# Altium schematic symbol library FPGA_Xilinx_Virtex5.SchLib: 41 symbols (part 27 of 27)
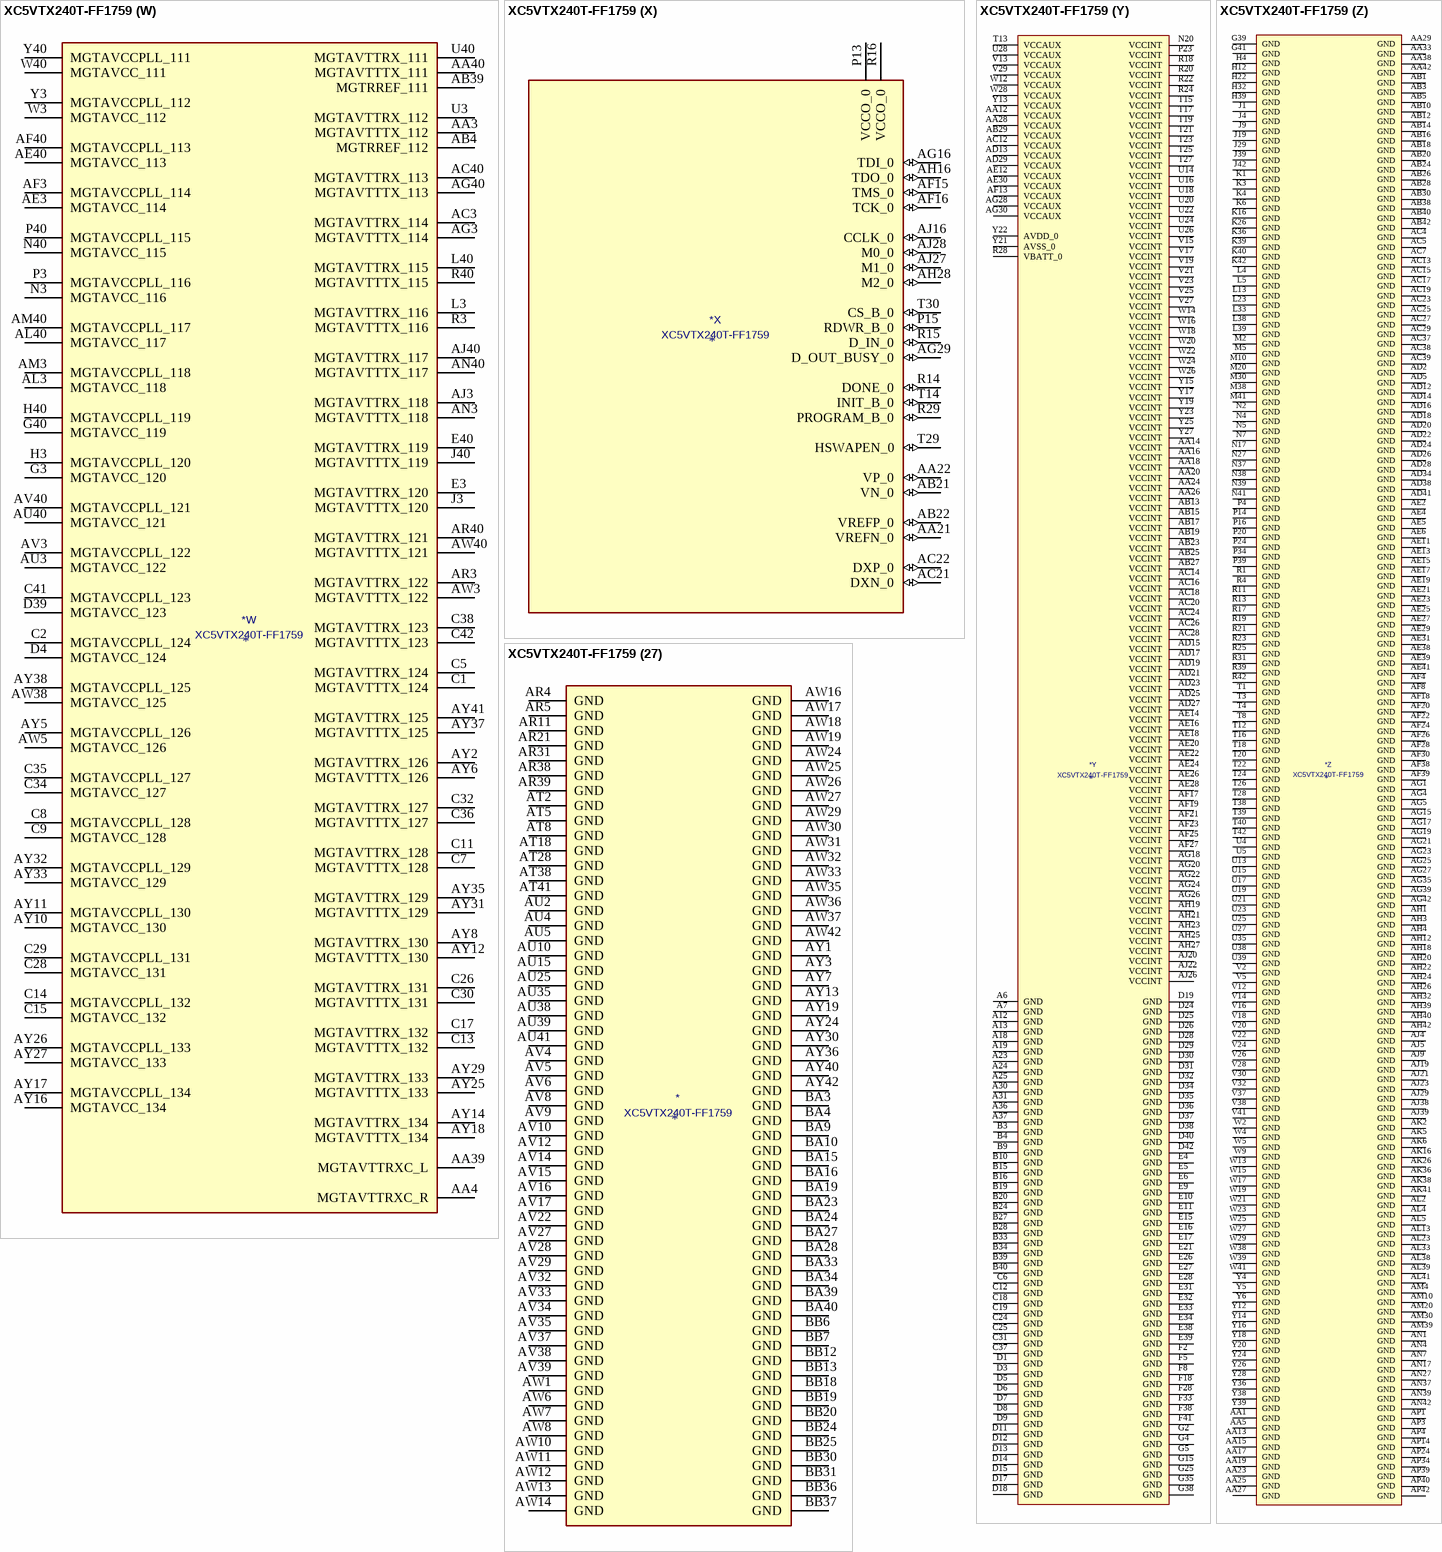
[diagram p163: symbol XC5VTX240T-FF1759]

## XC5VTX240T-FF1759
designator *  value XC5VTX240T-FF1759
ki_keywords: FPGA; ki_description: Virtex 5 TXT 240 XC5VTX240T-FF1759
part A pins: AA30 IO_L11P_CC_SM14P_11 (io), AA31 IO_L11N_CC_SM14N_11 (io), AA32 IO_L6N_11 (io), AA34 IO_L17N_SM11N_11 (io), AA35 IO_L13P_11 (io), AA36 IO_L4P_11 (io), AA37 IO_L2P_11 (io), AB31 IO_L19N_SM9N_11 (io), AB32 IO_L19P_SM9P_11 (io), AB34 IO_L17P_SM11P_11 (io), AB35 VCCO_11 (power), AB36 IO_L15N_SM13N_11 (io), AB37 IO_L4N_VREF_11 (io), AC36 IO_L15P_SM13P_11 (io), L14 IO_L5P_A9_D25_1 (io), M14 IO_L5N_A8_D24_1 (io), M15 VCCO_1 (power), M16 IO_L7P_A5_D21_1 (io), M29 IO_L6P_A7_D23_1 (io), N14 IO_L9N_CC_A0_D16_1 (io), N15 IO_L9P_CC_A1_D17_1 (io), N16 IO_L7N_A4_D20_1 (io), N18 IO_L3P_A13_D29_1 (io), N19 IO_L1P_A17_1 (io), N25 IO_L2N_A14_D30_1 (io), N26 IO_L2P_A15_D31_1 (io), N28 IO_L4P_A11_D27_1 (io), N29 IO_L6N_A6_D22_1 (io), P17 IO_L3N_A12_D28_1 (io), P18 IO_L1N_A16_1 (io), P19 VCCO_1 (power), P25 IO_L0N_A18_1 (io), P26 IO_L0P_A19_1 (io), P27 IO_L4N_VREF_A10_D26_1 (io), P28 IO_L8P_CC_A3_D19_1 (io), P29 VCCO_1 (power), R26 VCCO_1 (power), R27 IO_L8N_CC_A2_D18_1 (io), T35 IO_L12P_VRN_11 (io), T36 IO_L12N_VRP_11 (io), T37 IO_L9N_CC_11 (io), U30 VCCO_11 (power), U31 IO_L18P_SM10P_11 (io), U32 IO_L16P_SM12P_11 (io), U33 IO_L14P_11 (io), U34 IO_L14N_VREF_11 (io), U36 VCCO_11 (power), U37 IO_L9P_CC_11 (io), V31 IO_L18N_SM10N_11 (io), V33 IO_L16N_SM12N_11 (io), V34 IO_L7N_11 (io), V35 IO_L7P_11 (io), V36 IO_L3N_11 (io), W30 IO_L10P_CC_SM15P_11 (io), W31 IO_L10N_CC_SM15N_11 (io), W32 IO_L5N_11 (io), W33 IO_L5P_11 (io), W34 VCCO_11 (power), W35 IO_L1P_11 (io), W36 IO_L1N_11 (io), W37 IO_L3P_11 (io), Y29 IO_L0N_11 (io), Y30 IO_L0P_11 (io), Y31 VCCO_11 (power), Y32 IO_L6P_11 (io), Y33 IO_L8P_CC_11 (io), Y34 IO_L8N_CC_11 (io), Y35 IO_L13N_11 (io), Y37 IO_L2N_11 (io)
part B pins: AA6 IO_L5N_12 (io), AA7 IO_L5P_12 (io), AA8 VCCO_12 (power), AA9 IO_L3P_12 (io), AA10 IO_L10N_CC_12 (io), AA11 IO_L10P_CC_12 (io), AB6 IO_L7P_12 (io), AB7 IO_L9N_CC_12 (io), AB8 IO_L9P_CC_12 (io), AB9 IO_L12N_VRP_12 (io), AB11 IO_L18N_12 (io), AB33 IO_L2P_SM6P_13 (io), AC6 IO_L7N_12 (io), AC8 IO_L12P_VRN_12 (io), AC9 IO_L14P_12 (io), AC10 IO_L16N_12 (io), AC11 IO_L18P_12 (io), AC30 IO_L8N_CC_SM1N_13 (io), AC31 IO_L8P_CC_SM1P_13 (io), AC32 VCCO_13 (power), AC33 IO_L2N_SM6N_13 (io), AC34 IO_L0N_SM8N_13 (io), AC35 IO_L0P_SM8P_13 (io), AD8 IO_L14N_VREF_12 (io), AD9 VCCO_12 (power), AD11 IO_L16P_12 (io), AD30 IO_L16N_13 (io), AD31 IO_L16P_13 (io), AD32 IO_L15P_13 (io), AD33 IO_L15N_13 (io), AD35 IO_L6P_SM3P_13 (io), AD36 IO_L4N_VREF_13 (io), AD37 IO_L4P_13 (io), AE32 IO_L12N_VRP_13 (io), AE33 IO_L12P_VRN_13 (io), AE34 IO_L10N_CC_13 (io), AE35 IO_L6N_SM3N_13 (io), AE36 VCCO_13 (power), AE37 IO_L11N_CC_13 (io), AF31 IO_L5N_SM4N_13 (io), AF32 IO_L5P_SM4P_13 (io), AF33 VCCO_13 (power), AF34 IO_L10P_CC_13 (io), AF35 IO_L17N_13 (io), AF36 IO_L17P_13 (io), AF37 IO_L11P_CC_13 (io), AG31 IO_L1N_SM7N_13 (io), AG32 IO_L1P_SM7P_13 (io), AG33 IO_L3N_SM5N_13 (io), AG34 IO_L3P_SM5P_13 (io), AG36 IO_L19P_13 (io), AG37 IO_L19N_13 (io), AG38 IO_L13N_13 (io), AH36 IO_L18N_13 (io), AH37 VCCO_13 (power), AH38 IO_L13P_13 (io), AJ36 IO_L18P_13 (io), AJ37 IO_L14N_VREF_13 (io), AK37 IO_L14P_13 (io), AL36 IO_L7N_SM2N_13 (io), AL37 IO_L7P_SM2P_13 (io), AM37 VCCO_13 (power), AM38 IO_L9P_CC_SM0P_13 (io), AN38 IO_L9N_CC_SM0N_13 (io), N6 IO_L19N_12 (io), P5 IO_L0N_12 (io), P6 IO_L19P_12 (io), P7 IO_L17N_12 (io), R5 IO_L0P_12 (io), R6 VCCO_12 (power), R7 IO_L17P_12 (io), T5 IO_L2N_12 (io), T6 IO_L2P_12 (io), T7 IO_L11N_CC_12 (io), U6 IO_L4N_VREF_12 (io), U7 IO_L11P_CC_12 (io), V6 IO_L4P_12 (io), V7 VCCO_12 (power), V8 IO_L15P_12 (io), V9 IO_L15N_12 (io), W6 IO_L8N_CC_12 (io), W7 IO_L8P_CC_12 (io), W8 IO_L6P_12 (io), W10 IO_L13N_12 (io), W11 IO_L13P_12 (io), Y7 IO_L1P_12 (io), Y8 IO_L1N_12 (io), Y9 IO_L6N_12 (io), Y10 IO_L3N_12 (io), Y11 VCCO_12 (power)
part C pins: AD6 IO_L1N_14 (io), AD7 IO_L1P_14 (io), AD10 IO_L17P_14 (io), AE7 VCCO_14 (power), AE8 IO_L3P_14 (io), AE9 IO_L16N_14 (io), AE10 IO_L17N_14 (io), AF5 IO_L5P_14 (io), AF6 IO_L5N_14 (io), AF7 IO_L3N_14 (io), AF9 IO_L16P_14 (io), AF10 IO_L8P_CC_14 (io), AF11 IO_L2P_14 (io), AF12 IO_L0N_14 (io), AG6 IO_L7P_14 (io), AG7 IO_L9P_CC_14 (io), AG8 IO_L10P_CC_14 (io), AG9 IO_L8N_CC_14 (io), AG10 VCCO_14 (power), AG11 IO_L2N_14 (io), AG12 IO_L0P_14 (io), AH5 IO_L7N_14 (io), AH6 IO_L9N_CC_14 (io), AH7 VCCO_14 (power), AH8 IO_L10N_CC_14 (io), AH9 IO_L13P_14 (io), AH10 IO_L4N_VREF_14 (io), AH11 IO_L4P_14 (io), AH17 VCCO_2 (power), AJ6 IO_L12P_VRN_14 (io), AJ7 IO_L12N_VRP_14 (io), AJ8 IO_L13N_14 (io), AJ17 IO_L0P_CC_RS1_2 (io), AJ18 IO_L2N_A22_2 (io), AK7 IO_L14P_14 (io), AK8 IO_L11P_CC_14 (io), AK9 IO_L6P_14 (io), AK17 IO_L0N_CC_RS0_2 (io), AK18 IO_L2P_A23_2 (io), AK19 IO_L8N_D2_FS2_2 (io), AK27 IO_L1N_CC_A24_2 (io), AK28 IO_L1P_CC_A25_2 (io), AL6 IO_L14N_VREF_14 (io), AL7 IO_L11N_CC_14 (io), AL8 VCCO_14 (power), AL9 IO_L6N_14 (io), AL17 IO_L4P_FCS_B_2 (io), AL18 VCCO_2 (power), AL19 IO_L8P_D3_2 (io), AL27 IO_L3P_A21_2 (io), AL28 VCCO_2 (power), AM5 IO_L18P_14 (io), AM6 IO_L19P_14 (io), AM7 IO_L19N_14 (io), AM17 IO_L4N_VREF_FOE_B_MOSI_2 (io), AM18 IO_L6P_D7_2 (io), AM19 IO_L6N_D6_2 (io), AM27 IO_L3N_A20_2 (io), AN5 IO_L18N_14 (io), AN6 VCCO_14 (power), AN26 IO_L7N_D4_2 (io), AP5 IO_L15P_14 (io), AP6 IO_L15N_14 (io), AP25 IO_L9P_D1_FS1_2 (io), AP26 IO_L7P_D5_2 (io), AP27 IO_L5N_CSO_B_2 (io), AR25 IO_L9N_D0_FS0_2 (io), AR26 VCCO_2 (power), AR27 IO_L5P_FWE_B_2 (io)
part D pins: E7 IO_L3P_24 (io), E8 IO_L3N_24 (io), F6 IO_L5N_24 (io), F7 VCCO_24 (power), G6 IO_L5P_24 (io), G7 IO_L1P_24 (io), G8 IO_L1N_24 (io), G37 IO_L4P_23 (io), H5 IO_L7N_24 (io), H6 IO_L7P_24 (io), H7 VCCO_24 (power), H8 IO_L9N_CC_24 (io), H34 IO_L0N_23 (io), H35 IO_L2P_23 (io), H36 IO_L2N_23 (io), H37 VCCO_23 (power), H38 IO_L4N_VREF_23 (io), J5 IO_L14N_VREF_24 (io), J6 IO_L14P_24 (io), J7 IO_L18P_24 (io), J8 IO_L9P_CC_24 (io), J33 IO_L0P_23 (io), J34 VCCO_23 (power), J35 IO_L15N_23 (io), J36 IO_L15P_23 (io), J37 IO_L8P_CC_23 (io), J38 IO_L8N_CC_23 (io), K5 IO_L4N_VREF_24 (io), K7 IO_L19P_24 (io), K8 IO_L18N_24 (io), K9 IO_L12P_VRN_24 (io), K33 IO_L6N_23 (io), K34 IO_L6P_23 (io), K35 IO_L19N_23 (io), K37 IO_L17P_23 (io), K38 IO_L17N_23 (io), L6 IO_L4P_24 (io), L7 IO_L19N_24 (io), L8 VCCO_24 (power), L9 IO_L12N_VRP_24 (io), L34 IO_L19P_23 (io), L35 IO_L12P_VRN_23 (io), L36 IO_L12N_VRP_23 (io), L37 IO_L16N_23 (io), M6 IO_L17N_24 (io), M7 IO_L17P_24 (io), M8 IO_L15P_24 (io), M9 IO_L16N_24 (io), M34 IO_L14N_VREF_23 (io), M35 VCCO_23 (power), M36 IO_L10N_CC_23 (io), M37 IO_L16P_23 (io), N8 IO_L15N_24 (io), N9 IO_L16P_24 (io), N33 IO_L11N_CC_23 (io), N34 IO_L14P_23 (io), N35 IO_L7N_23 (io), N36 IO_L10P_CC_23 (io), P8 IO_L11N_CC_24 (io), P9 VCCO_24 (power), P10 IO_L10P_CC_24 (io), P33 IO_L11P_CC_23 (io), P35 IO_L7P_23 (io), P36 IO_L5N_23 (io), P37 IO_L1N_23 (io), P38 IO_L3N_23 (io), R8 IO_L8P_CC_24 (io), R9 IO_L11P_CC_24 (io), R10 IO_L10N_CC_24 (io), R32 IO_L13N_23 (io), R33 IO_L13P_23 (io), R34 IO_L9P_CC_23 (io), R35 IO_L5P_23 (io), R36 VCCO_23 (power), R37 IO_L1P_23 (io), R38 IO_L3P_23 (io), T9 IO_L8N_CC_24 (io), T10 IO_L13N_24 (io), T11 IO_L13P_24 (io), T31 IO_L18P_23 (io), T32 IO_L18N_23 (io), T33 VCCO_23 (power), T34 IO_L9N_CC_23 (io), U8 IO_L6N_24 (io), U9 IO_L6P_24 (io), U10 VCCO_24 (power), U11 IO_L2N_24 (io), U12 IO_L0N_24 (io), V10 IO_L2P_24 (io), V11 IO_L0P_24 (io)
part E pins: AH33 IO_L10N_CC_25 (io), AH34 IO_L10P_CC_25 (io), AH35 IO_L12P_VRN_25 (io), AJ10 IO_L4P_26 (io), AJ11 IO_L4N_VREF_26 (io), AJ12 IO_L9P_CC_26 (io), AJ31 IO_L3P_25 (io), AJ32 IO_L3N_25 (io), AJ33 IO_L0P_25 (io), AJ34 VCCO_25 (power), AJ35 IO_L12N_VRP_25 (io), AK10 IO_L2N_26 (io), AK11 VCCO_26 (power), AK12 IO_L9N_CC_26 (io), AK32 IO_L13P_25 (io), AK33 IO_L13N_25 (io), AK34 IO_L0N_25 (io), AK35 IO_L9N_CC_25 (io), AL10 IO_L2P_26 (io), AL11 IO_L7N_26 (io), AL12 IO_L10N_CC_26 (io), AL31 IO_L19P_25 (io), AL32 IO_L19N_25 (io), AL34 IO_L9P_CC_25 (io), AL35 IO_L18P_25 (io), AM8 IO_L17N_26 (io), AM9 IO_L17P_26 (io), AM11 IO_L7P_26 (io), AM12 IO_L10P_CC_26 (io), AM13 IO_L18P_26 (io), AM31 IO_L17P_25 (io), AM32 IO_L17N_25 (io), AM33 IO_L8N_CC_25 (io), AM34 IO_L6P_25 (io), AM35 VCCO_25 (power), AM36 IO_L18N_25 (io), AN8 IO_L15N_26 (io), AN9 IO_L6P_26 (io), AN10 IO_L6N_26 (io), AN11 IO_L3N_26 (io), AN12 VCCO_26 (power), AN13 IO_L18N_26 (io), AN31 IO_L15P_25 (io), AN32 VCCO_25 (power), AN33 IO_L8P_CC_25 (io), AN34 IO_L6N_25 (io), AN35 IO_L16N_25 (io), AN36 IO_L16P_25 (io), AP7 IO_L19N_26 (io), AP8 IO_L15P_26 (io), AP9 VCCO_26 (power), AP10 IO_L3P_26 (io), AP11 IO_L5P_26 (io), AP12 IO_L5N_26 (io), AP13 IO_L16P_26 (io), AP31 IO_L15N_25 (io), AP32 IO_L11P_CC_25 (io), AP33 IO_L11N_CC_25 (io), AP35 IO_L7N_25 (io), AP36 IO_L7P_25 (io), AP37 IO_L14P_25 (io), AP38 IO_L14N_VREF_25 (io), AR6 IO_L19P_26 (io), AR7 IO_L8P_CC_26 (io), AR8 IO_L0P_26 (io), AR9 IO_L0N_26 (io), AR10 IO_L1P_26 (io), AR12 IO_L16N_26 (io), AR35 IO_L4P_25 (io), AR36 VCCO_25 (power), AR37 IO_L5N_25 (io), AT6 IO_L13N_26 (io), AT7 IO_L8N_CC_26 (io), AT9 IO_L1N_26 (io), AT10 IO_L12N_VRP_26 (io), AT11 VCCO_26 (power), AT35 IO_L4N_VREF_25 (io), AT36 IO_L1P_25 (io), AT37 IO_L5P_25 (io), AU6 IO_L13P_26 (io), AU7 VCCO_26 (power), AU8 IO_L11P_CC_26 (io), AU9 IO_L12P_VRN_26 (io), AU11 IO_L14P_26 (io), AU36 IO_L2N_25 (io), AU37 IO_L1N_25 (io), AV7 IO_L11N_CC_26 (io), AV11 IO_L14N_VREF_26 (io), AV36 IO_L2P_25 (io)
part F pins: E12 IO_L4P_28 (io), E13 IO_L4N_VREF_28 (io), E14 IO_L15P_28 (io), E29 IO_L16P_27 (io), E30 IO_L14N_VREF_27 (io), E35 IO_L4N_VREF_27 (io), E36 IO_L4P_27 (io), E37 IO_L6P_27 (io), F9 IO_L0N_28 (io), F10 IO_L0P_28 (io), F11 IO_L2N_28 (io), F12 IO_L11N_CC_28 (io), F13 VCCO_28 (power), F14 IO_L15N_28 (io), F15 IO_L17P_28 (io), F29 IO_L16N_27 (io), F30 IO_L14P_27 (io), F31 IO_L12N_VRP_27 (io), F32 IO_L5N_27 (io), F34 IO_L3P_27 (io), F35 IO_L2P_27 (io), F36 VCCO_27 (power), F37 IO_L6N_27 (io), G9 IO_L3P_28 (io), G10 VCCO_28 (power), G11 IO_L2P_28 (io), G12 IO_L11P_CC_28 (io), G13 IO_L13N_28 (io), G14 IO_L17N_28 (io), G29 IO_L18P_27 (io), G30 VCCO_27 (power), G31 IO_L12P_VRN_27 (io), G32 IO_L5P_27 (io), G33 VCCO_27 (power), G34 IO_L3N_27 (io), G36 IO_L2N_27 (io), H9 IO_L3N_28 (io), H10 IO_L1N_28 (io), H11 IO_L8P_CC_28 (io), H13 IO_L13P_28 (io), H14 IO_L19P_28 (io), H15 IO_L19N_28 (io), H29 IO_L18N_27 (io), H30 IO_L10N_CC_27 (io), H31 IO_L7P_27 (io), H33 IO_L1N_27 (io), J10 IO_L5P_28 (io), J11 IO_L1P_28 (io), J12 IO_L8N_CC_28 (io), J13 IO_L6N_28 (io), J30 IO_L10P_CC_27 (io), J31 IO_L7N_27 (io), J32 IO_L1P_27 (io), K10 IO_L5N_28 (io), K11 VCCO_28 (power), K12 IO_L7N_28 (io), K13 IO_L7P_28 (io), K14 IO_L6P_28 (io), K29 IO_L9P_CC_27 (io), K30 IO_L0N_27 (io), K31 VCCO_27 (power), K32 IO_L8N_CC_27 (io), L10 IO_L10P_CC_28 (io), L11 IO_L10N_CC_28 (io), L12 IO_L9P_CC_28 (io), L29 IO_L9N_CC_27 (io), L30 IO_L0P_27 (io), L31 IO_L8P_CC_27 (io), L32 IO_L11N_CC_27 (io), M11 IO_L14P_28 (io), M12 IO_L9N_CC_28 (io), M13 IO_L12N_VRP_28 (io), M31 IO_L13P_27 (io), M32 IO_L13N_27 (io), M33 IO_L11P_CC_27 (io), N10 IO_L14N_VREF_28 (io), N11 IO_L16N_28 (io), N12 VCCO_28 (power), N13 IO_L12P_VRN_28 (io), N30 IO_L15N_27 (io), N31 IO_L15P_27 (io), N32 VCCO_27 (power), P11 IO_L16P_28 (io), P12 IO_L18P_28 (io), P30 IO_L19P_27 (io), P31 IO_L17P_27 (io), P32 IO_L17N_27 (io), R12 IO_L18N_28 (io), R30 IO_L19N_27 (io)
part G pins: AH29 IO_L0N_29 (io), AH30 IO_L0P_29 (io), AH31 IO_L2P_29 (io), AJ30 IO_L2N_29 (io), AK29 IO_L4P_29 (io), AK30 IO_L4N_VREF_29 (io), AK31 VCCO_29 (power), AL29 IO_L17P_29 (io), AL30 IO_L17N_29 (io), AM28 IO_L9P_CC_29 (io), AM29 IO_L15P_29 (io), AN28 IO_L1P_29 (io), AN29 IO_L9N_CC_29 (io), AN30 IO_L15N_29 (io), AP28 IO_L1N_29 (io), AP29 VCCO_29 (power), AP30 IO_L12N_VRP_29 (io), AR28 IO_L10P_CC_29 (io), AR29 IO_L10N_CC_29 (io), AR30 IO_L12P_VRN_29 (io), AR32 IO_L13P_29 (io), AR33 IO_L8N_CC_29 (io), AR34 IO_L8P_CC_29 (io), AT25 IO_L3N_29 (io), AT26 IO_L3P_29 (io), AT27 IO_L7N_29 (io), AT29 IO_L14P_29 (io), AT30 IO_L19P_29 (io), AT31 IO_L19N_29 (io), AT32 IO_L13N_29 (io), AT33 VCCO_29 (power), AT34 IO_L6N_29 (io), AU26 VCCO_29 (power), AU27 IO_L7P_29 (io), AU28 IO_L14N_VREF_29 (io), AU29 IO_L16P_29 (io), AU30 VCCO_29 (power), AU31 IO_L18N_29 (io), AU32 IO_L11P_CC_29 (io), AU33 IO_L11N_CC_29 (io), AU34 IO_L6P_29 (io), AV25 IO_L5N_29 (io), AV26 IO_L5P_29 (io), AV30 IO_L16N_29 (io), AV31 IO_L18P_29 (io), J14 VCCO_3 (power), J15 IO_L2P_GC_VRN_3 (io), J16 IO_L2N_GC_VRP_3 (io), K15 IO_L4N_GC_VREF_3 (io), K27 IO_L7P_GC_3 (io), K28 IO_L7N_GC_3 (io), L15 IO_L4P_GC_3 (io), L16 IO_L8P_GC_3 (io), L17 IO_L8N_GC_3 (io), L18 VCCO_3 (power), L19 IO_L0P_CC_GC_3 (io), L25 IO_L3N_GC_3 (io), L26 IO_L5P_GC_3 (io), L27 IO_L5N_GC_3 (io), L28 VCCO_3 (power), M17 IO_L6P_GC_3 (io), M18 IO_L6N_GC_3 (io), M19 IO_L0N_CC_GC_3 (io), M24 IO_L1N_CC_GC_3 (io), M25 VCCO_3 (power), M26 IO_L3P_GC_3 (io), M27 IO_L9N_GC_3 (io), M28 IO_L9P_GC_3 (io), N24 IO_L1P_CC_GC_3 (io)
part H pins: AG13 IO_L3N_30 (io), AH13 IO_L5P_30 (io), AH14 IO_L3P_30 (io), AH15 IO_L1N_30 (io), AJ13 IO_L5N_30 (io), AJ14 VCCO_30 (power), AJ15 IO_L1P_30 (io), AJ24 VCCO_4 (power), AJ25 IO_L4P_GC_4 (io), AK13 IO_L7P_30 (io), AK14 IO_L7N_30 (io), AK15 IO_L19P_30 (io), AK20 IO_L9P_CC_GC_4 (io), AK21 VCCO_4 (power), AK23 IO_L8P_CC_GC_4 (io), AK24 IO_L8N_CC_GC_4 (io), AK25 IO_L4N_GC_VREF_4 (io), AL14 IO_L16N_30 (io), AL15 IO_L19N_30 (io), AL16 IO_L4P_30 (io), AL20 IO_L9N_CC_GC_4 (io), AL21 IO_L7P_GC_VRN_4 (io), AL24 IO_L6N_GC_4 (io), AL25 IO_L6P_GC_4 (io), AL26 IO_L0P_GC_D15_4 (io), AM14 IO_L16P_30 (io), AM15 VCCO_30 (power), AM16 IO_L4N_VREF_30 (io), AM21 IO_L7N_GC_VRP_4 (io), AM24 IO_L2N_GC_D10_4 (io), AM25 VCCO_4 (power), AM26 IO_L0N_GC_D14_4 (io), AN14 IO_L10P_CC_30 (io), AN15 IO_L10N_CC_30 (io), AN16 IO_L11P_CC_30 (io), AN18 IO_L2P_30 (io), AN19 IO_L1N_GC_D12_4 (io), AN20 IO_L1P_GC_D13_4 (io), AN25 IO_L2P_GC_D11_4 (io), AP15 IO_L14P_30 (io), AP16 IO_L15N_30 (io), AP17 IO_L11N_CC_30 (io), AP18 IO_L2N_30 (io), AP19 VCCO_4 (power), AP20 IO_L5N_GC_4 (io), AP21 IO_L5P_GC_4 (io), AR13 IO_L9N_CC_30 (io), AR14 IO_L14N_VREF_30 (io), AR15 IO_L15P_30 (io), AR16 VCCO_30 (power), AR17 IO_L8N_CC_30 (io), AR18 IO_L0N_30 (io), AR19 IO_L0P_30 (io), AR20 IO_L3P_GC_D9_4 (io), AT12 IO_L9P_CC_30 (io), AT13 VCCO_30 (power), AT14 IO_L12N_VRP_30 (io), AT15 IO_L17N_30 (io), AT16 IO_L13P_30 (io), AT17 IO_L8P_CC_30 (io), AT20 IO_L3N_GC_D8_4 (io), AU12 IO_L18P_30 (io), AU13 IO_L12P_VRN_30 (io), AU14 IO_L17P_30 (io), AU16 IO_L13N_30 (io), AU17 IO_L6N_30 (io), AU18 IO_L6P_30 (io), AV13 IO_L18N_30 (io)
part I pins: AK22 IO_L12N_VRP_6 (io), AL22 IO_L12P_VRN_6 (io), AM22 IO_L10N_CC_6 (io), AM23 IO_L8P_CC_6 (io), AN21 IO_L10P_CC_6 (io), AN22 VCCO_6 (power), AN23 IO_L13P_6 (io), AN24 IO_L8N_CC_6 (io), AP22 IO_L17N_6 (io), AP23 IO_L13N_6 (io), AR22 IO_L17P_6 (io), AR23 IO_L15P_6 (io), AR24 IO_L0P_6 (io), AT19 IO_L7P_6 (io), AT21 IO_L19N_6 (io), AT22 IO_L15N_6 (io), AT23 VCCO_6 (power), AT24 IO_L0N_6 (io), AU19 IO_L7N_6 (io), AU20 VCCO_6 (power), AU21 IO_L19P_6 (io), AU22 IO_L18N_6 (io), AU23 IO_L6N_6 (io), AU24 IO_L2N_6 (io), AV18 IO_L1P_6 (io), AV19 IO_L1N_6 (io), AV20 IO_L9P_CC_6 (io), AV21 IO_L18P_6 (io), AV23 IO_L6P_6 (io), AV24 IO_L2P_6 (io), AW20 IO_L9N_CC_6 (io), AW21 IO_L16P_6 (io), AW22 IO_L16N_6 (io), AW23 IO_L11P_CC_6 (io), AY20 IO_L14N_VREF_6 (io), AY21 VCCO_6 (power), AY22 IO_L5N_6 (io), AY23 IO_L11N_CC_6 (io), BA20 IO_L14P_6 (io), BA21 IO_L5P_6 (io), BA22 IO_L3P_6 (io), BB21 IO_L3N_6 (io), BB22 IO_L4P_6 (io), BB23 IO_L4N_VREF_6 (io), E18 IO_L14N_VREF_5 (io), E19 IO_L14P_5 (io), E20 IO_L1P_5 (io), F16 IO_L16N_5 (io), F17 IO_L16P_5 (io), F19 IO_L5P_5 (io), F20 IO_L1N_5 (io), F26 IO_L8P_CC_5 (io), F27 IO_L13N_5 (io), G16 IO_L18N_5 (io), G17 IO_L7N_5 (io), G18 IO_L7P_5 (io), G19 IO_L5N_5 (io), G20 VCCO_5 (power), G24 IO_L6P_5 (io), G26 IO_L8N_CC_5 (io), G27 IO_L13P_5 (io), G28 IO_L17N_5 (io), H16 IO_L18P_5 (io), H17 VCCO_5 (power), H18 IO_L12N_VRP_5 (io), H19 IO_L3N_5 (io), H20 IO_L3P_5 (io), H23 IO_L4P_5 (io), H24 IO_L4N_VREF_5 (io), H25 IO_L6N_5 (io), H26 IO_L15N_5 (io), H27 VCCO_5 (power), H28 IO_L17P_5 (io), J17 IO_L9P_CC_5 (io), J18 IO_L12P_VRN_5 (io), J23 IO_L0N_5 (io), J24 VCCO_5 (power), J25 IO_L11N_CC_5 (io), J26 IO_L15P_5 (io), J27 IO_L19N_5 (io), J28 IO_L19P_5 (io), K17 IO_L9N_CC_5 (io), K18 IO_L10P_CC_5 (io), K19 IO_L10N_CC_5 (io), K23 IO_L0P_5 (io), K24 IO_L2P_5 (io), K25 IO_L11P_CC_5 (io), L24 IO_L2N_5 (io)
part J pins: A20 IO_L14P_7 (io), A21 IO_L14N_VREF_7 (io), A22 IO_L11N_CC_7 (io), B21 IO_L11P_CC_7 (io), B22 IO_L8P_CC_7 (io), B23 IO_L8N_CC_7 (io), C20 IO_L12N_VRP_7 (io), C21 IO_L6P_7 (io), C22 VCCO_7 (power), C23 IO_L4N_VREF_7 (io), D20 IO_L12P_VRN_7 (io), D21 IO_L6N_7 (io), D22 IO_L4P_7 (io), D23 IO_L3P_7 (io), E22 IO_L3N_7 (io), E23 IO_L17N_7 (io), E24 IO_L17P_7 (io), E25 IO_L19N_7 (io), F21 IO_L9P_CC_7 (io), F22 IO_L5P_7 (io), F23 VCCO_7 (power), F24 IO_L13N_7 (io), F25 IO_L19P_7 (io), G21 IO_L9N_CC_7 (io), G22 IO_L5N_7 (io), G23 IO_L13P_7 (io), H21 IO_L10N_CC_7 (io), J20 IO_L10P_CC_7 (io), J21 IO_L0N_7 (io), J22 IO_L0P_7 (io), K20 IO_L16N_7 (io), K21 VCCO_7 (power), K22 IO_L7P_7 (io), L20 IO_L16P_7 (io), L21 IO_L7N_7 (io), L22 IO_L2N_7 (io), M21 IO_L1N_7 (io), M22 IO_L2P_7 (io), M23 IO_L15P_7 (io), N21 IO_L1P_7 (io), N22 VCCO_7 (power), N23 IO_L15N_7 (io), P21 IO_L18P_7 (io), P22 IO_L18N_7 (io)
part K pins: AA2 MGTTXP1_112 (io), AA41 MGTTXP1_111 (io), T2 MGTTXP0_112 (io), T41 MGTTXP0_111 (io), U1 MGTRXP0_112 (io), U2 MGTTXN0_112 (io), U41 MGTTXN0_111 (io), U42 MGTRXP0_111 (io), V1 MGTRXN0_112 (io), V3 MGTREFCLKN_112 (io), V4 MGTREFCLKP_112 (io), V39 MGTREFCLKP_111 (io), V40 MGTREFCLKN_111 (io), V42 MGTRXN0_111 (io), W1 MGTRXN1_112 (io), W42 MGTRXN1_111 (io), Y1 MGTRXP1_112 (io), Y2 MGTTXN1_112 (io), Y41 MGTTXN1_111 (io), Y42 MGTRXP1_111 (io)
part L pins: AB2 MGTTXP0_114 (io), AB41 MGTTXP0_113 (io), AC1 MGTRXP0_114 (io), AC2 MGTTXN0_114 (io), AC41 MGTTXN0_113 (io), AC42 MGTRXP0_113 (io), AD1 MGTRXN0_114 (io), AD3 MGTREFCLKN_114 (io), AD4 MGTREFCLKP_114 (io), AD39 MGTREFCLKP_113 (io), AD40 MGTREFCLKN_113 (io), AD42 MGTRXN0_113 (io), AE1 MGTRXN1_114 (io), AE42 MGTRXN1_113 (io), AF1 MGTRXP1_114 (io), AF2 MGTTXN1_114 (io), AF41 MGTTXN1_113 (io), AF42 MGTRXP1_113 (io), AG2 MGTTXP1_114 (io), AG41 MGTTXP1_113 (io)
part M pins: K2 MGTTXP0_116 (io), K41 MGTTXP0_115 (io), L1 MGTRXP0_116 (io), L2 MGTTXN0_116 (io), L41 MGTTXN0_115 (io), L42 MGTRXP0_115 (io), M1 MGTRXN0_116 (io), M3 MGTREFCLKN_116 (io), M4 MGTREFCLKP_116 (io), M39 MGTREFCLKP_115 (io), M40 MGTREFCLKN_115 (io), M42 MGTRXN0_115 (io), N1 MGTRXN1_116 (io), N42 MGTRXN1_115 (io), P1 MGTRXP1_116 (io), P2 MGTTXN1_116 (io), P41 MGTTXN1_115 (io), P42 MGTRXP1_115 (io), R2 MGTTXP1_116 (io), R41 MGTTXP1_115 (io)
part N pins: AH2 MGTTXP0_118 (io), AH41 MGTTXP0_117 (io), AJ1 MGTRXP0_118 (io), AJ2 MGTTXN0_118 (io), AJ41 MGTTXN0_117 (io), AJ42 MGTRXP0_117 (io), AK1 MGTRXN0_118 (io), AK3 MGTREFCLKN_118 (io), AK4 MGTREFCLKP_118 (io), AK39 MGTREFCLKP_117 (io), AK40 MGTREFCLKN_117 (io), AK42 MGTRXN0_117 (io), AL1 MGTRXN1_118 (io), AL42 MGTRXN1_117 (io), AM1 MGTRXP1_118 (io), AM2 MGTTXN1_118 (io), AM41 MGTTXN1_117 (io), AM42 MGTRXP1_117 (io), AN2 MGTTXP1_118 (io), AN41 MGTTXP1_117 (io)
part O pins: D2 MGTTXP0_120 (io), D41 MGTTXP0_119 (io), E1 MGTRXP0_120 (io), E2 MGTTXN0_120 (io), E41 MGTTXN0_119 (io), E42 MGTRXP0_119 (io), F1 MGTRXN0_120 (io), F3 MGTREFCLKN_120 (io), F4 MGTREFCLKP_120 (io), F39 MGTREFCLKP_119 (io), F40 MGTREFCLKN_119 (io), F42 MGTRXN0_119 (io), G1 MGTRXN1_120 (io), G42 MGTRXN1_119 (io), H1 MGTRXP1_120 (io), H2 MGTTXN1_120 (io), H41 MGTTXN1_119 (io), H42 MGTRXP1_119 (io), J2 MGTTXP1_120 (io), J41 MGTTXP1_119 (io)
part P pins: AP2 MGTTXP0_122 (io), AP41 MGTTXP0_121 (io), AR1 MGTRXP0_122 (io), AR2 MGTTXN0_122 (io), AR41 MGTTXN0_121 (io), AR42 MGTRXP0_121 (io), AT1 MGTRXN0_122 (io), AT3 MGTREFCLKN_122 (io), AT4 MGTREFCLKP_122 (io), AT39 MGTREFCLKP_121 (io), AT40 MGTREFCLKN_121 (io), AT42 MGTRXN0_121 (io), AU1 MGTRXN1_122 (io), AU42 MGTRXN1_121 (io), AV1 MGTRXP1_122 (io), AV2 MGTTXN1_122 (io), AV41 MGTTXN1_121 (io), AV42 MGTRXP1_121 (io), AW2 MGTTXP1_122 (io), AW41 MGTTXP1_121 (io)
part Q pins: A2 MGTRXP1_124 (io), A3 MGTRXN1_124 (io), A4 MGTRXN0_124 (io), A5 MGTRXP0_124 (io), A38 MGTRXP0_123 (io), A39 MGTRXN0_123 (io), A40 MGTRXN1_123 (io), A41 MGTRXP1_123 (io), B1 MGTTXP1_124 (io), B2 MGTTXN1_124 (io), B5 MGTTXN0_124 (io), B6 MGTTXP0_124 (io), B37 MGTTXP0_123 (io), B38 MGTTXN0_123 (io), B41 MGTTXN1_123 (io), B42 MGTTXP1_123 (io), C3 MGTREFCLKN_124 (io), C4 MGTREFCLKP_124 (io), C39 MGTREFCLKP_123 (io), C40 MGTREFCLKN_123 (io)
part R pins: AW4 MGTREFCLKP_126 (io), AW39 MGTREFCLKP_125 (io), AY4 MGTREFCLKN_126 (io), AY39 MGTREFCLKN_125 (io), BA1 MGTTXP0_126 (io), BA2 MGTTXN0_126 (io), BA5 MGTTXN1_126 (io), BA6 MGTTXP1_126 (io), BA37 MGTTXP1_125 (io), BA38 MGTTXN1_125 (io), BA41 MGTTXN0_125 (io), BA42 MGTTXP0_125 (io), BB2 MGTRXP0_126 (io), BB3 MGTRXN0_126 (io), BB4 MGTRXN1_126 (io), BB5 MGTRXP1_126 (io), BB38 MGTRXP1_125 (io), BB39 MGTRXN1_125 (io), BB40 MGTRXN0_125 (io), BB41 MGTRXP0_125 (io)
part S pins: A8 MGTRXP1_128 (io), A9 MGTRXN1_128 (io), A10 MGTRXN0_128 (io), A11 MGTRXP0_128 (io), A32 MGTRXP0_127 (io), A33 MGTRXN0_127 (io), A34 MGTRXN1_127 (io), A35 MGTRXP1_127 (io), B7 MGTTXP1_128 (io), B8 MGTTXN1_128 (io), B11 MGTTXN0_128 (io), B12 MGTTXP0_128 (io), B31 MGTTXP0_127 (io), B32 MGTTXN0_127 (io), B35 MGTTXN1_127 (io), B36 MGTTXP1_127 (io), C10 MGTREFCLKN_128 (io), C33 MGTREFCLKN_127 (io), D10 MGTREFCLKP_128 (io), D33 MGTREFCLKP_127 (io)
part T pins: AW9 MGTREFCLKP_130 (io), AW34 MGTREFCLKP_129 (io), AY9 MGTREFCLKN_130 (io), AY34 MGTREFCLKN_129 (io), BA7 MGTTXP0_130 (io), BA8 MGTTXN0_130 (io), BA11 MGTTXN1_130 (io), BA12 MGTTXP1_130 (io), BA31 MGTTXP1_129 (io), BA32 MGTTXN1_129 (io), BA35 MGTTXN0_129 (io), BA36 MGTTXP0_129 (io), BB8 MGTRXP0_130 (io), BB9 MGTRXN0_130 (io), BB10 MGTRXN1_130 (io), BB11 MGTRXP1_130 (io), BB32 MGTRXP1_129 (io), BB33 MGTRXN1_129 (io), BB34 MGTRXN0_129 (io), BB35 MGTRXP0_129 (io)
part U pins: A14 MGTRXP1_132 (io), A15 MGTRXN1_132 (io), A16 MGTRXN0_132 (io), A17 MGTRXP0_132 (io), A26 MGTRXP0_131 (io), A27 MGTRXN0_131 (io), A28 MGTRXN1_131 (io), A29 MGTRXP1_131 (io), B13 MGTTXP1_132 (io), B14 MGTTXN1_132 (io), B17 MGTTXN0_132 (io), B18 MGTTXP0_132 (io), B25 MGTTXP0_131 (io), B26 MGTTXN0_131 (io), B29 MGTTXN1_131 (io), B30 MGTTXP1_131 (io), C16 MGTREFCLKN_132 (io), C27 MGTREFCLKN_131 (io), D16 MGTREFCLKP_132 (io), D27 MGTREFCLKP_131 (io)
part V pins: AW15 MGTREFCLKP_134 (io), AW28 MGTREFCLKP_133 (io), AY15 MGTREFCLKN_134 (io), AY28 MGTREFCLKN_133 (io), BA13 MGTTXP0_134 (io), BA14 MGTTXN0_134 (io), BA17 MGTTXN1_134 (io), BA18 MGTTXP1_134 (io), BA25 MGTTXP1_133 (io), BA26 MGTTXN1_133 (io), BA29 MGTTXN0_133 (io), BA30 MGTTXP0_133 (io), BB14 MGTRXP0_134 (io), BB15 MGTRXN0_134 (io), BB16 MGTRXN1_134 (io), BB17 MGTRXP1_134 (io), BB26 MGTRXP1_133 (io), BB27 MGTRXN1_133 (io), BB28 MGTRXN0_133 (io), BB29 MGTRXP0_133 (io)
part W pins: AA3 MGTAVTTTX_112 (power), AA4 MGTAVTTRXC_R (power), AA39 MGTAVTTRXC_L (power), AA40 MGTAVTTTX_111 (power), AB4 MGTRREF_112 (power), AB39 MGTRREF_111 (power), AC3 MGTAVTTRX_114 (power), AC40 MGTAVTTRX_113 (power), AE3 MGTAVCC_114 (power), AE40 MGTAVCC_113 (power), AF3 MGTAVCCPLL_114 (power), AF40 MGTAVCCPLL_113 (power), AG3 MGTAVTTTX_114 (power), AG40 MGTAVTTTX_113 (power), AJ3 MGTAVTTRX_118 (power), AJ40 MGTAVTTRX_117 (power), AL3 MGTAVCC_118 (power), AL40 MGTAVCC_117 (power), AM3 MGTAVCCPLL_118 (power), AM40 MGTAVCCPLL_117 (power), AN3 MGTAVTTTX_118 (power), AN40 MGTAVTTTX_117 (power), AR3 MGTAVTTRX_122 (power), AR40 MGTAVTTRX_121 (power), AU3 MGTAVCC_122 (power), AU40 MGTAVCC_121 (power), AV3 MGTAVCCPLL_122 (power), AV40 MGTAVCCPLL_121 (power), AW3 MGTAVTTTX_122 (power), AW5 MGTAVCC_126 (power), AW38 MGTAVCC_125 (power), AW40 MGTAVTTTX_121 (power), AY2 MGTAVTTRX_126 (power), AY5 MGTAVCCPLL_126 (power), AY6 MGTAVTTTX_126 (power), AY8 MGTAVTTRX_130 (power), AY10 MGTAVCC_130 (power), AY11 MGTAVCCPLL_130 (power), AY12 MGTAVTTTX_130 (power), AY14 MGTAVTTRX_134 (power), AY16 MGTAVCC_134 (power), AY17 MGTAVCCPLL_134 (power), AY18 MGTAVTTTX_134 (power), AY25 MGTAVTTTX_133 (power), AY26 MGTAVCCPLL_133 (power), AY27 MGTAVCC_133 (power), AY29 MGTAVTTRX_133 (power), AY31 MGTAVTTTX_129 (power), AY32 MGTAVCCPLL_129 (power), AY33 MGTAVCC_129 (power), AY35 MGTAVTTRX_129 (power), AY37 MGTAVTTTX_125 (power), AY38 MGTAVCCPLL_125 (power), AY41 MGTAVTTRX_125 (power), C1 MGTAVTTTX_124 (power), C2 MGTAVCCPLL_124 (power), C5 MGTAVTTRX_124 (power), C7 MGTAVTTTX_128 (power), C8 MGTAVCCPLL_128 (power), C9 MGTAVCC_128 (power), C11 MGTAVTTRX_128 (power), C13 MGTAVTTTX_132 (power), C14 MGTAVCCPLL_132 (power), C15 MGTAVCC_132 (power), C17 MGTAVTTRX_132 (power), C26 MGTAVTTRX_131 (power), C28 MGTAVCC_131 (power), C29 MGTAVCCPLL_131 (power), C30 MGTAVTTTX_131 (power), C32 MGTAVTTRX_127 (power), C34 MGTAVCC_127 (power), C35 MGTAVCCPLL_127 (power), C36 MGTAVTTTX_127 (power), C38 MGTAVTTRX_123 (power), C41 MGTAVCCPLL_123 (power), C42 MGTAVTTTX_123 (power), D4 MGTAVCC_124 (power), D39 MGTAVCC_123 (power), E3 MGTAVTTRX_120 (power), E40 MGTAVTTRX_119 (power), G3 MGTAVCC_120 (power), G40 MGTAVCC_119 (power), H3 MGTAVCCPLL_120 (power), H40 MGTAVCCPLL_119 (power), J3 MGTAVTTTX_120 (power), J40 MGTAVTTTX_119 (power), L3 MGTAVTTRX_116 (power), L40 MGTAVTTRX_115 (power), N3 MGTAVCC_116 (power), N40 MGTAVCC_115 (power), P3 MGTAVCCPLL_116 (power), P40 MGTAVCCPLL_115 (power), R3 MGTAVTTTX_116 (power), R40 MGTAVTTTX_115 (power), U3 MGTAVTTRX_112 (power), U40 MGTAVTTRX_111 (power), W3 MGTAVCC_112 (power), W40 MGTAVCC_111 (power), Y3 MGTAVCCPLL_112 (power), Y40 MGTAVCCPLL_111 (power)
part X pins: AA21 VREFN_0 (io), AA22 VP_0 (io), AB21 VN_0 (io), AB22 VREFP_0 (io), AC21 DXN_0 (io), AC22 DXP_0 (io), AF15 TMS_0 (io), AF16 TCK_0 (io), AG16 TDI_0 (io), AG29 D_OUT_BUSY_0 (io), AH16 TDO_0 (io), AH28 M2_0 (io), AJ16 CCLK_0 (io), AJ27 M1_0 (io), AJ28 M0_0 (io), P13 VCCO_0 (power), P15 RDWR_B_0 (io), R14 DONE_0 (io), R15 D_IN_0 (io), R16 VCCO_0 (power), R29 PROGRAM_B_0 (io), T14 INIT_B_0 (io), T29 HSWAPEN_0 (io), T30 CS_B_0 (io)
part Y pins: A6 GND (power), A7 GND (power), A12 GND (power), A13 GND (power), A18 GND (power), A19 GND (power), A23 GND (power), A24 GND (power), A25 GND (power), A30 GND (power), A31 GND (power), A36 GND (power), A37 GND (power), AA12 VCCAUX (power), AA14 VCCINT (power), AA16 VCCINT (power), AA18 VCCINT (power), AA20 VCCINT (power), AA24 VCCINT (power), AA26 VCCINT (power), AA28 VCCAUX (power), AB13 VCCINT (power), AB15 VCCINT (power), AB17 VCCINT (power), AB19 VCCINT (power), AB23 VCCINT (power), AB25 VCCINT (power), AB27 VCCINT (power), AB29 VCCAUX (power), AC12 VCCAUX (power), AC14 VCCINT (power), AC16 VCCINT (power), AC18 VCCINT (power), AC20 VCCINT (power), AC24 VCCINT (power), AC26 VCCINT (power), AC28 VCCINT (power), AD13 VCCAUX (power), AD15 VCCINT (power), AD17 VCCINT (power), AD19 VCCINT (power), AD21 VCCINT (power), AD23 VCCINT (power), AD25 VCCINT (power), AD27 VCCINT (power), AD29 VCCAUX (power), AE12 VCCAUX (power), AE14 VCCINT (power), AE16 VCCINT (power), AE18 VCCINT (power), AE20 VCCINT (power), AE22 VCCINT (power), AE24 VCCINT (power), AE26 VCCINT (power), AE28 VCCINT (power), AE30 VCCAUX (power), AF13 VCCAUX (power), AF17 VCCINT (power), AF19 VCCINT (power), AF21 VCCINT (power), AF23 VCCINT (power), AF25 VCCINT (power), AF27 VCCINT (power), AG18 VCCINT (power), AG20 VCCINT (power), AG22 VCCINT (power), AG24 VCCINT (power), AG26 VCCINT (power), AG28 VCCAUX (power), AG30 VCCAUX (power), AH19 VCCINT (power), AH21 VCCINT (power), AH23 VCCINT (power), AH25 VCCINT (power), AH27 VCCINT (power), AJ20 VCCINT (power), AJ22 VCCINT (power), AJ26 VCCINT (power), B3 GND (power), B4 GND (power), B9 GND (power), B10 GND (power), B15 GND (power), B16 GND (power), B19 GND (power), B20 GND (power), B24 GND (power), B27 GND (power), B28 GND (power), B33 GND (power), B34 GND (power), B39 GND (power), B40 GND (power), C6 GND (power), C12 GND (power), C18 GND (power), C19 GND (power), C24 GND (power), C25 GND (power), C31 GND (power), C37 GND (power), D1 GND (power), D3 GND (power), D5 GND (power), D6 GND (power), D7 GND (power), D8 GND (power), D9 GND (power), D11 GND (power), D12 GND (power), D13 GND (power), D14 GND (power), D15 GND (power), D17 GND (power), D18 GND (power), D19 GND (power), D24 GND (power), D25 GND (power), D26 GND (power), D28 GND (power), D29 GND (power), D30 GND (power), D31 GND (power), D32 GND (power), D34 GND (power), D35 GND (power), D36 GND (power), D37 GND (power), D38 GND (power), D40 GND (power), D42 GND (power), E4 GND (power), E5 GND (power), E6 GND (power), E9 GND (power), E10 GND (power), E11 GND (power), E15 GND (power), E16 GND (power), E17 GND (power), E21 GND (power), E26 GND (power), E27 GND (power), E28 GND (power), E31 GND (power), E32 GND (power), E33 GND (power), E34 GND (power), E38 GND (power), E39 GND (power), F2 GND (power), F5 GND (power), F8 GND (power), F18 GND (power), F28 GND (power), F33 GND (power), F38 GND (power), F41 GND (power), G2 GND (power), G4 GND (power), G5 GND (power), G15 GND (power), G25 GND (power), G35 GND (power), G38 GND (power), N20 VCCINT (power), P23 VCCINT (power), R18 VCCINT (power), R20 VCCINT (power), R22 VCCINT (power), R24 VCCINT (power), R28 VBATT_0 (power), T13 VCCAUX (power), T15 VCCINT (power), T17 VCCINT (power), T19 VCCINT (power), T21 VCCINT (power), T23 VCCINT (power), T25 VCCINT (power), T27 VCCINT (power), U14 VCCINT (power), U16 VCCINT (power), U18 VCCINT (power), U20 VCCINT (power), U22 VCCINT (power), U24 VCCINT (power), U26 VCCINT (power), U28 VCCAUX (power), V13 VCCAUX (power), V15 VCCINT (power), V17 VCCINT (power), V19 VCCINT (power), V21 VCCINT (power), V23 VCCINT (power), V25 VCCINT (power), V27 VCCINT (power), V29 VCCAUX (power), W12 VCCAUX (power), W14 VCCINT (power), W16 VCCINT (power), W18 VCCINT (power), W20 VCCINT (power), W22 VCCINT (power), W24 VCCINT (power), W26 VCCINT (power), W28 VCCAUX (power), Y13 VCCAUX (power), Y15 VCCINT (power), Y17 VCCINT (power), Y19 VCCINT (power), Y21 AVSS_0 (power), Y22 AVDD_0 (power), Y23 VCCINT (power), Y25 VCCINT (power), Y27 VCCINT (power)
part Z pins: AA1 GND (power), AA5 GND (power), AA13 GND (power), AA15 GND (power), AA17 GND (power), AA19 GND (power), AA23 GND (power), AA25 GND (power), AA27 GND (power), AA29 GND (power), AA33 GND (power), AA38 GND (power), AA42 GND (power), AB1 GND (power), AB3 GND (power), AB5 GND (power), AB10 GND (power), AB12 GND (power), AB14 GND (power), AB16 GND (power), AB18 GND (power), AB20 GND (power), AB24 GND (power), AB26 GND (power), AB28 GND (power), AB30 GND (power), AB38 GND (power), AB40 GND (power), AB42 GND (power), AC4 GND (power), AC5 GND (power), AC7 GND (power), AC13 GND (power), AC15 GND (power), AC17 GND (power), AC19 GND (power), AC23 GND (power), AC25 GND (power), AC27 GND (power), AC29 GND (power), AC37 GND (power), AC38 GND (power), AC39 GND (power), AD2 GND (power), AD5 GND (power), AD12 GND (power), AD14 GND (power), AD16 GND (power), AD18 GND (power), AD20 GND (power), AD22 GND (power), AD24 GND (power), AD26 GND (power), AD28 GND (power), AD34 GND (power), AD38 GND (power), AD41 GND (power), AE2 GND (power), AE4 GND (power), AE5 GND (power), AE6 GND (power), AE11 GND (power), AE13 GND (power), AE15 GND (power), AE17 GND (power), AE19 GND (power), AE21 GND (power), AE23 GND (power), AE25 GND (power), AE27 GND (power), AE29 GND (power), AE31 GND (power), AE38 GND (power), AE39 GND (power), AE41 GND (power), AF4 GND (power), AF8 GND (power), AF18 GND (power), AF20 GND (power), AF22 GND (power), AF24 GND (power), AF26 GND (power), AF28 GND (power), AF30 GND (power), AF38 GND (power), AF39 GND (power), AG1 GND (power), AG4 GND (power), AG5 GND (power), AG15 GND (power), AG17 GND (power), AG19 GND (power), AG21 GND (power), AG23 GND (power), AG25 GND (power), AG27 GND (power), AG35 GND (power), AG39 GND (power), AG42 GND (power), AH1 GND (power), AH3 GND (power), AH4 GND (power), AH12 GND (power), AH18 GND (power), AH20 GND (power), AH22 GND (power), AH24 GND (power), AH26 GND (power), AH32 GND (power), AH39 GND (power), AH40 GND (power), AH42 GND (power), AJ4 GND (power), AJ5 GND (power), AJ9 GND (power), AJ19 GND (power), AJ21 GND (power), AJ23 GND (power), AJ29 GND (power), AJ38 GND (power), AJ39 GND (power), AK2 GND (power), AK5 GND (power), AK6 GND (power), AK16 GND (power), AK26 GND (power), AK36 GND (power), AK38 GND (power), AK41 GND (power), AL2 GND (power), AL4 GND (power), AL5 GND (power), AL13 GND (power), AL23 GND (power), AL33 GND (power), AL38 GND (power), AL39 GND (power), AL41 GND (power), AM4 GND (power), AM10 GND (power), AM20 GND (power), AM30 GND (power), AM39 GND (power), AN1 GND (power), AN4 GND (power), AN7 GND (power), AN17 GND (power), AN27 GND (power), AN37 GND (power), AN39 GND (power), AN42 GND (power), AP1 GND (power), AP3 GND (power), AP4 GND (power), AP14 GND (power), AP24 GND (power), AP34 GND (power), AP39 GND (power), AP40 GND (power), AP42 GND (power), G39 GND (power), G41 GND (power), H4 GND (power), H12 GND (power), H22 GND (power), H32 GND (power), H39 GND (power), J1 GND (power), J4 GND (power), J9 GND (power), J19 GND (power), J29 GND (power), J39 GND (power), J42 GND (power), K1 GND (power), K3 GND (power), K4 GND (power), K6 GND (power), K16 GND (power), K26 GND (power), K36 GND (power), K39 GND (power), K40 GND (power), K42 GND (power), L4 GND (power), L5 GND (power), L13 GND (power), L23 GND (power), L33 GND (power), L38 GND (power), L39 GND (power), M2 GND (power), M5 GND (power), M10 GND (power), M20 GND (power), M30 GND (power), M38 GND (power), M41 GND (power), N2 GND (power), N4 GND (power), N5 GND (power), N7 GND (power), N17 GND (power), N27 GND (power), N37 GND (power), N38 GND (power), N39 GND (power), N41 GND (power), P4 GND (power), P14 GND (power), P16 GND (power), P20 GND (power), P24 GND (power), P34 GND (power), P39 GND (power), R1 GND (power), R4 GND (power), R11 GND (power), R13 GND (power), R17 GND (power), R19 GND (power), R21 GND (power), R23 GND (power), R25 GND (power), R31 GND (power), R39 GND (power), R42 GND (power), T1 GND (power), T3 GND (power), T4 GND (power), T8 GND (power), T12 GND (power), T16 GND (power), T18 GND (power), T20 GND (power), T22 GND (power), T24 GND (power), T26 GND (power), T28 GND (power), T38 GND (power), T39 GND (power), T40 GND (power), T42 GND (power), U4 GND (power), U5 GND (power), U13 GND (power), U15 GND (power), U17 GND (power), U19 GND (power), U21 GND (power), U23 GND (power), U25 GND (power), U27 GND (power), U35 GND (power), U38 GND (power), U39 GND (power), V2 GND (power), V5 GND (power), V12 GND (power), V14 GND (power), V16 GND (power), V18 GND (power), V20 GND (power), V22 GND (power), V24 GND (power), V26 GND (power), V28 GND (power), V30 GND (power), V32 GND (power), V37 GND (power), V38 GND (power), V41 GND (power), W2 GND (power), W4 GND (power), W5 GND (power), W9 GND (power), W13 GND (power), W15 GND (power), W17 GND (power), W19 GND (power), W21 GND (power), W23 GND (power), W25 GND (power), W27 GND (power), W29 GND (power), W38 GND (power), W39 GND (power), W41 GND (power), Y4 GND (power), Y5 GND (power), Y6 GND (power), Y12 GND (power), Y14 GND (power), Y16 GND (power), Y18 GND (power), Y20 GND (power), Y24 GND (power), Y26 GND (power), Y28 GND (power), Y36 GND (power), Y38 GND (power), Y39 GND (power)
part 27 pins: AR4 GND (power), AR5 GND (power), AR11 GND (power), AR21 GND (power), AR31 GND (power), AR38 GND (power), AR39 GND (power), AT2 GND (power), AT5 GND (power), AT8 GND (power), AT18 GND (power), AT28 GND (power), AT38 GND (power), AT41 GND (power), AU2 GND (power), AU4 GND (power), AU5 GND (power), AU10 GND (power), AU15 GND (power), AU25 GND (power), AU35 GND (power), AU38 GND (power), AU39 GND (power), AU41 GND (power), AV4 GND (power), AV5 GND (power), AV6 GND (power), AV8 GND (power), AV9 GND (power), AV10 GND (power), AV12 GND (power), AV14 GND (power), AV15 GND (power), AV16 GND (power), AV17 GND (power), AV22 GND (power), AV27 GND (power), AV28 GND (power), AV29 GND (power), AV32 GND (power), AV33 GND (power), AV34 GND (power), AV35 GND (power), AV37 GND (power), AV38 GND (power), AV39 GND (power), AW1 GND (power), AW6 GND (power), AW7 GND (power), AW8 GND (power), AW10 GND (power), AW11 GND (power), AW12 GND (power), AW13 GND (power), AW14 GND (power), AW16 GND (power), AW17 GND (power), AW18 GND (power), AW19 GND (power), AW24 GND (power), AW25 GND (power), AW26 GND (power), AW27 GND (power), AW29 GND (power), AW30 GND (power), AW31 GND (power), AW32 GND (power), AW33 GND (power), AW35 GND (power), AW36 GND (power), AW37 GND (power), AW42 GND (power), AY1 GND (power), AY3 GND (power), AY7 GND (power), AY13 GND (power), AY19 GND (power), AY24 GND (power), AY30 GND (power), AY36 GND (power), AY40 GND (power), AY42 GND (power), BA3 GND (power), BA4 GND (power), BA9 GND (power), BA10 GND (power), BA15 GND (power), BA16 GND (power), BA19 GND (power), BA23 GND (power), BA24 GND (power), BA27 GND (power), BA28 GND (power), BA33 GND (power), BA34 GND (power), BA39 GND (power), BA40 GND (power), BB6 GND (power), BB7 GND (power), BB12 GND (power), BB13 GND (power), BB18 GND (power), BB19 GND (power), BB20 GND (power), BB24 GND (power), BB25 GND (power), BB30 GND (power), BB31 GND (power), BB36 GND (power), BB37 GND (power)